# Altium footprint library PcbLib.PcbLib: 68 footprints (part 1 of 5)
Each footprint in its own frame and in the unit in brackets; x right, y up, seen from the top. Pads: shape width x height; smd on the part's side, far side on the other; paste and mask are expansions set on the pad; w line width, h text height; cw(c..) or ccw(c..) is an arc to the next point about the centre after c.
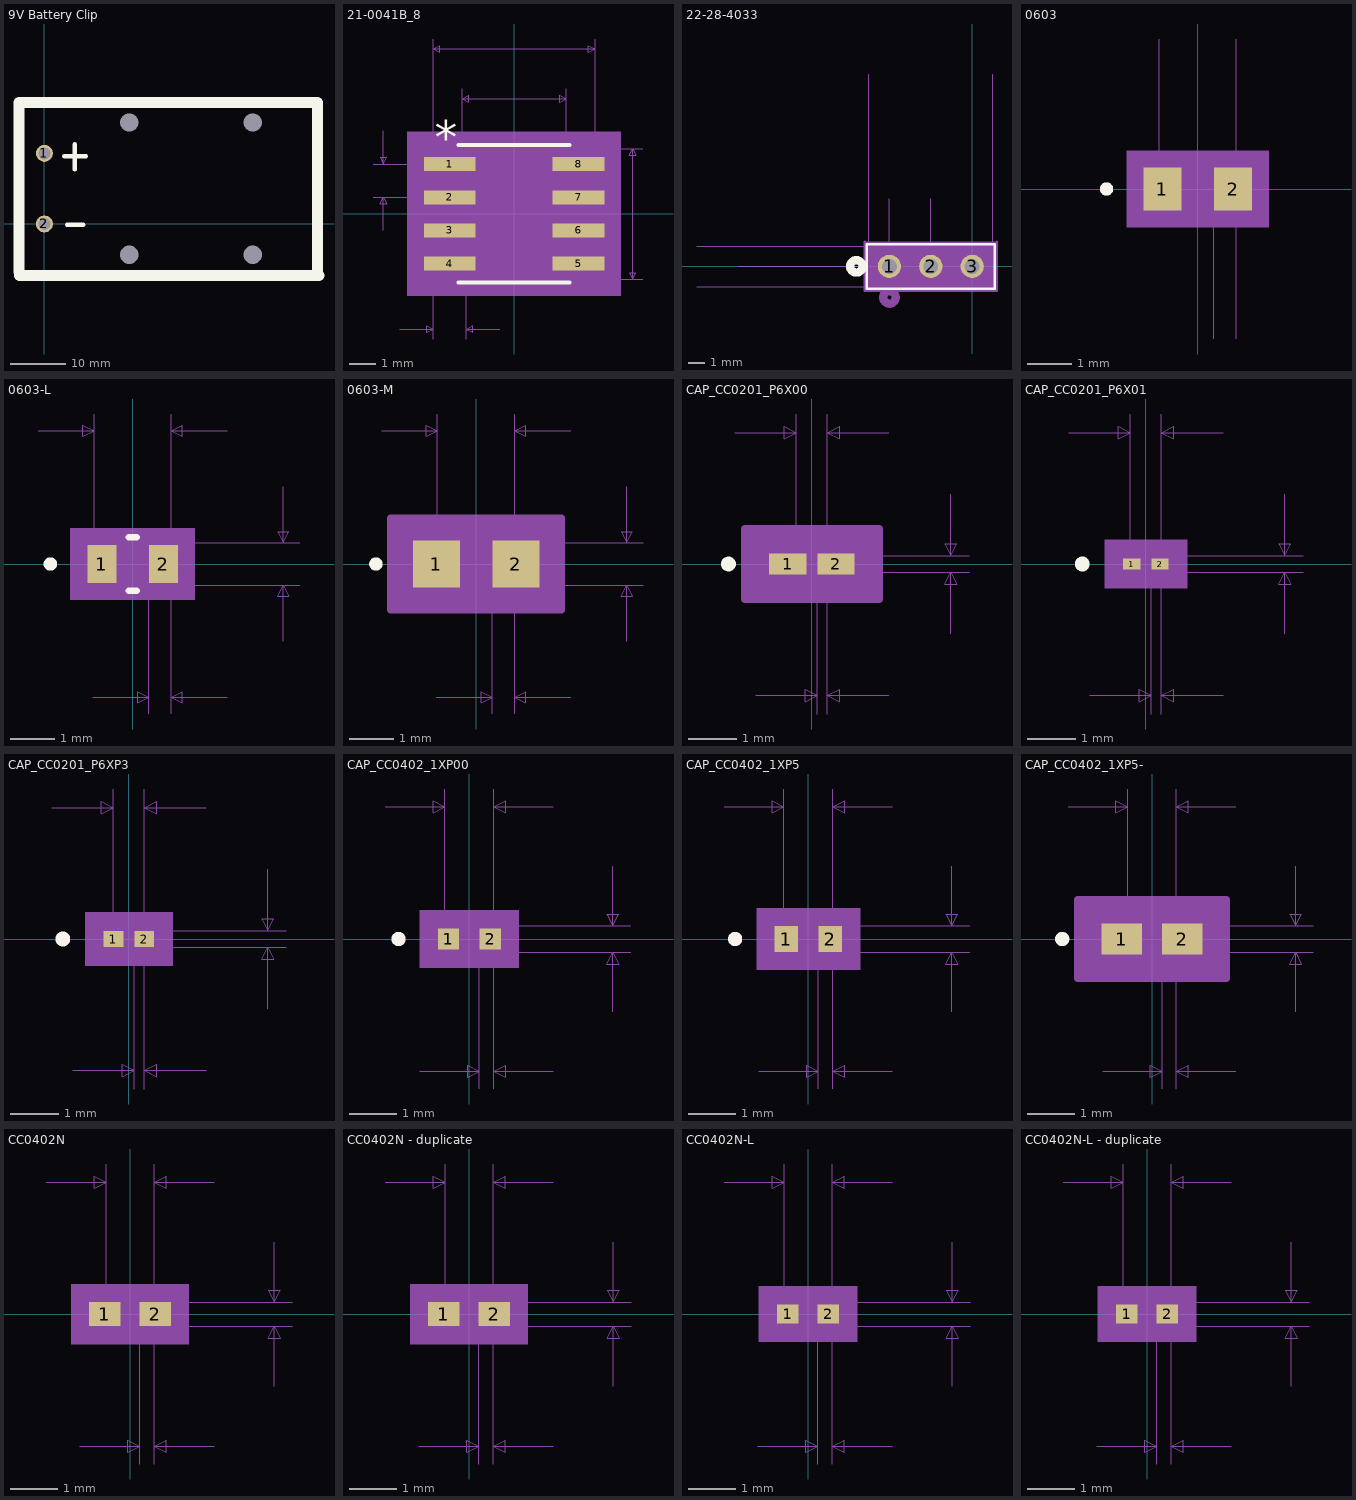
[diagram p0: the footprints below, top view; thin cyan lines are the x and y axes]

## 9V Battery Clip [mil]
pads (7):
  round 120 hole 85: 1(0,500) 2(0,0) 2(0,0)
  round 120 hole 130 unplated: ""(600,-219) ""(600,719) ""(1475,-219) ""(1475,719)
Top Overlay:
  lines w30: 140,480 295,480 ; 160,-5 275,-5 ; 215,385 215,565
  lines w80: -180,-340 -180,860 1930,860 ; -175,-365 1945,-365 ; 1935,-340 1935,860

## 21-0041B_8 [mil]
pads (8):
  rect 78x21 smd: 1(-97,75) 2(-97,25) 3(-97,-25) 4(-97,-75) 5(97,-75) 6(97,-25) 7(97,25) 8(97,75)
Top Overlay:
  lines w6: -83.5,-103.5 83.5,-103.5 ; -83.5,103.5 83.5,103.5
  text "*" at -119.5,91 h50
Mechanical 5:
  region: 161,-123.5 -161,-123.5 -161,123.5 161,123.5
Mechanical 7:
  lines w1: -212,25 -97,25 ; -212,75 -97,75 ; -197,-25 -197,25 ; -197,125 -197,75 ; -172,-173.5 -122,-173.5 ; -122,-188.5 -122,0 -122,263.5 ; -78.5,0 -78.5,188.5 ; -72,-188.5 -72,0 ; -22,-173.5 -72,-173.5 ; 0,-98.5 193.5,-98.5 ; 0,98.5 193.5,98.5 ; 78.5,0 78.5,188.5 ; 122,0 122,263.5 ; -197,25 -202,15 -192,15 -197,25 ; -197,75 -202,85 -192,85 -197,75 ; -122,-173.5 -132,-168.5 -132,-178.5 -122,-173.5 ; -122,248.5 122,248.5 ; -122,248.5 -112,253.5 -112,243.5 -122,248.5 ; -78.5,173.5 78.5,173.5 ; -78.5,173.5 -68.5,178.5 -68.5,168.5 -78.5,173.5 ; -72,-173.5 -62,-168.5 -62,-178.5 -72,-173.5 ; 78.5,173.5 68.5,178.5 68.5,168.5 78.5,173.5 ; 122,248.5 112,253.5 112,243.5 122,248.5 ; 178.5,-98.5 178.5,98.5 ; 178.5,-98.5 173.5,-88.5 183.5,-88.5 178.5,-98.5 ; 178.5,98.5 173.5,88.5 183.5,88.5 178.5,98.5
  text "Default Padstyle: RX78Y21D0T" at -350,-298.5 h50
  text "Pin One Padstyle: RX78Y21D0T" at -350,-358.5 h50
  text "Alt 1 Padstyle: OX60Y90D30P" at -337.5,-538.5 h50
  text "Alt 2 Padstyle: OX90Y60D30P" at -337.5,-598.5 h50
  text "0.157in/3.988mm" at -93.75,193.5 h25
  text "0.244in/6.198mm" at -93.75,268.5 h25
  text "0.197in/5.004mm" at 198.5,-12.5 h25
  text "0.05in/1.27mm" at -379.5,37.5 h25
  text "0.05in/1.27mm" at -178.25,-218.5 h25
Mechanical 13:
  lines w0: -12,98.5 ccw(c0,98.5) 12,98.5
  lines w1: -122,-84.5 -122,-65.5 -78.5,-65.5 -78.5,-84.5 -122,-84.5 ; -122,-34.5 -122,-15.5 -78.5,-15.5 -78.5,-34.5 -122,-34.5 ; -122,15.5 -122,34.5 -78.5,34.5 -78.5,15.5 -122,15.5 ; -122,65.5 -122,84.5 -78.5,84.5 -78.5,65.5 -122,65.5 ; -78.5,-98.5 78.5,-98.5 78.5,98.5 -78.5,98.5 -78.5,-98.5 ; 78.5,-84.5 78.5,-65.5 122,-65.5 122,-84.5 78.5,-84.5 ; 78.5,-34.5 78.5,-15.5 122,-15.5 122,-34.5 78.5,-34.5 ; 78.5,15.5 78.5,34.5 122,34.5 122,15.5 78.5,15.5 ; 78.5,65.5 78.5,84.5 122,84.5 122,65.5 78.5,65.5
  text "*" at -76,45.5 h50
Mechanical 15:
  region: -88.5,-95.5 -146,-95.5 -146,95.5 -88.5,95.5 -88.5,108.5 88.5,108.5 88.5,95.5 146,95.5 146,-95.5 88.5,-95.5 88.5,-108.5 -88.5,-108.5
  lines w6: -146,-95.5 -146,95.5 -88.5,95.5 -88.5,108.5 88.5,108.5 88.5,95.5 146,95.5 146,-95.5 88.5,-95.5 88.5,-108.5 -88.5,-108.5 -88.5,-95.5 -146,-95.5
3D body: height 10, standoff 0, extent 0,0 10,10

## 22-28-4033 [mil]
pads (3):
  round 56 hole 36: 1(-200,0) 2(-100,0) 3(0,0)
Top Overlay:
  circle w20: c-280,0 r15
  lines w6: -255,-54 55,-54 55,54 -255,54 -255,-54
Bottom Overlay:
  circle w20: c-280,0 r15
Mechanical 7:
  lines w1: -665,-49 -250,-49 ; -665,49 -250,49 ; -565,0 -100,0 -100,164 ; -565,49 -250,49 ; -250,464 -250,49 ; -200,0 -200,164 ; 50,49 50,464
Mechanical 13:
  circle w20: c-200,-75 r15
  lines w1: -250,-49 50,-49 50,49 -250,49 -250,-49
Mechanical 15:
  region: 60,59 -260,59 -260,-59 60,-59
  region: 50,49 -250,49 -250,-49 50,-49
  lines w6: -260,59 -260,-59 60,-59 60,59
3D body: height 10, standoff 0, extent 0,0 10,10

## 0603 [mil]
pads (2):
  rect 34x38 smd: 1(-31.5,0) 2(31.5,0)
Top Overlay:
  circle w6: c-81.5,0 r3
Mechanical 5:
  region: 63.5,-34 -63.5,-34 -63.5,34 63.5,34
Mechanical 7:
  lines w1: -34.5,0 -34.5,134 ; 14.5,-134 14.5,0 ; 34.5,-134 34.5,0 34.5,134
Mechanical 13:
  circle w0: c-81.5,0 r3
  lines w1: -34.5,-19 -34.5,19 ; -34.5,-19 -14.5,-19 -14.5,19 -34.5,19 ; -34.5,-19 34.5,-19 ; -34.5,-19 -34.5,19 ; -34.5,19 34.5,19 ; 34.5,-19 14.5,-19 14.5,19 34.5,19 ; 34.5,-19 34.5,19 ; 34.5,-19 34.5,19
Mechanical 15:
  region: 58.5,-29 -58.5,-29 -58.5,29 58.5,29
  lines w6: -58.5,-29 -58.5,29 58.5,29 58.5,-29 -58.5,-29
3D body: height 10, standoff 0, extent 0,0 10,10

## 0603-L [mil]
pads (2):
  rect 26x34 smd paste+0 mask+0: 1(-27.5,0) 2(27.5,0)
Top Overlay:
  circle w6: c-73.5,0 r3
  lines w6: -3.43,-24 3.43,-24 ; -3.43,24 3.43,24
Mechanical 5:
  region: 55.5,-32 -55.5,-32 -55.5,32 55.5,32
Mechanical 7:
  lines w1: -84.5,119 -34.5,119 ; -35.5,-119 14.5,-119 ; -34.5,0 -34.5,134 ; 0,-19 149.5,-19 ; 0,19 149.5,19 ; 14.5,-134 14.5,0 ; 34.5,-134 34.5,0 34.5,134 ; 84.5,-119 34.5,-119 ; 84.5,119 34.5,119 ; 134.5,-69 134.5,-19 ; 134.5,69 134.5,19 ; -34.5,119 -44.5,114 -44.5,124 -34.5,119 ; 14.5,-119 4.5,-124 4.5,-114 14.5,-119 ; 34.5,-119 44.5,-124 44.5,-114 34.5,-119 ; 34.5,119 44.5,114 44.5,124 34.5,119 ; 134.5,-19 139.5,-29 129.5,-29 134.5,-19 ; 134.5,19 139.5,29 129.5,29 134.5,19
  text "0.02in/0.508mm" at -63,-164 h25
  text "0.069in/1.753mm" at -93.75,139 h25
  text "0.038in/0.965mm" at 154.5,-12.5 h25
  text "Alternate 2 Padstyle: OX90Y60D30P" at -412.5,-487 h50
  text "Alternate 1 Padstyle: OX60Y90D30P" at -412.5,-387 h50
  text "Default Padstyle: RX26Y34D0T" at -350,-287 h50
Mechanical 13:
  circle w0: c-22.5,0 r3
  lines w1: -34.5,-19 -34.5,19 ; -34.5,-19 34.5,-19 ; -34.5,-19 -14.5,-19 -14.5,19 -34.5,19 ; -34.5,-19 -34.5,19 ; -34.5,19 34.5,19 ; 34.5,-19 34.5,19 ; 34.5,-19 34.5,19 ; 34.5,-19 14.5,-19 14.5,19 34.5,19
Mechanical 15:
  region: 44.5,-21 -44.5,-21 -44.5,21 44.5,21
  lines w6: -44.5,-21 44.5,-21 44.5,21 -44.5,21 -44.5,-21
3D body: height 10, standoff 0, extent 0,0 10,10

## 0603-M [mil]
pads (2):
  rect 42x42 smd paste+0 mask+0: 1(-35.5,0) 2(35.5,0)
Top Overlay:
  circle w6: c-89.5,0 r3
Mechanical 5:
  region: 71.5,-36 -71.5,-36 -71.5,36 71.5,36
Mechanical 7:
  lines w1: -84.5,119 -34.5,119 ; -35.5,-119 14.5,-119 ; -34.5,0 -34.5,134 ; 0,-19 149.5,-19 ; 0,19 149.5,19 ; 14.5,-134 14.5,0 ; 34.5,-134 34.5,0 34.5,134 ; 84.5,-119 34.5,-119 ; 84.5,119 34.5,119 ; 134.5,-69 134.5,-19 ; 134.5,69 134.5,19 ; -34.5,119 -44.5,124 -44.5,114 -34.5,119 ; 14.5,-119 4.5,-114 4.5,-124 14.5,-119 ; 34.5,-119 44.5,-114 44.5,-124 34.5,-119 ; 34.5,119 44.5,124 44.5,114 34.5,119 ; 134.5,-19 129.5,-29 139.5,-29 134.5,-19 ; 134.5,19 129.5,29 139.5,29 134.5,19
  text "Default Padstyle: RX42Y42D0T" at -350,-291 h50
  text "Alternate 1 Padstyle: OX60Y90D30P" at -412.5,-391 h50
  text "Alternate 2 Padstyle: OX90Y60D30P" at -412.5,-491 h50
  text "0.038in/0.965mm" at 154.5,-12.5 h25
  text "0.069in/1.753mm" at -93.75,139 h25
  text "0.02in/0.508mm" at -63,-164 h25
Mechanical 13:
  circle w0: c-30.5,0 r3
  lines w1: -34.5,-19 -34.5,19 ; -34.5,-19 -14.5,-19 -14.5,19 -34.5,19 ; -34.5,-19 34.5,-19 ; -34.5,-19 -34.5,19 ; -34.5,19 34.5,19 ; 34.5,-19 14.5,-19 14.5,19 34.5,19 ; 34.5,-19 34.5,19 ; 34.5,-19 34.5,19
Mechanical 15:
  region: 76.5,-41 -76.5,-41 -76.5,41 76.5,41
  lines w6: -76.5,-41 -76.5,41 76.5,41 76.5,-41 -76.5,-41
3D body: height 10, standoff 0, extent 0,0 10,10

## CAP_CC0201_P6X00 [mil]
pads (2):
  rect 30x17 smd paste+0 mask+0: 1(-19.5,0) 2(19.5,0)
Top Overlay:
  circle w6: c-67.5,0 r3
Mechanical 5:
  region: 49.5,-23.5 -49.5,-23.5 -49.5,23.5 49.5,23.5
Mechanical 7:
  lines w1: -62.5,106.5 -12.5,106.5 ; -45.5,-106.5 4.5,-106.5 ; -12.5,0 -12.5,121.5 ; 0,-6.5 127.5,-6.5 ; 0,6.5 127.5,6.5 ; 4.5,-121.5 4.5,0 ; 12.5,-121.5 12.5,0 12.5,121.5 ; 62.5,-106.5 12.5,-106.5 ; 62.5,106.5 12.5,106.5 ; 112.5,-56.5 112.5,-6.5 ; 112.5,56.5 112.5,6.5 ; -12.5,106.5 -22.5,111.5 -22.5,101.5 -12.5,106.5 ; 4.5,-106.5 -5.5,-101.5 -5.5,-111.5 4.5,-106.5 ; 12.5,-106.5 22.5,-101.5 22.5,-111.5 12.5,-106.5 ; 12.5,106.5 22.5,111.5 22.5,101.5 12.5,106.5 ; 112.5,-6.5 107.5,-16.5 117.5,-16.5 112.5,-6.5 ; 112.5,6.5 107.5,16.5 117.5,16.5 112.5,6.5
  text "Default Padstyle: RX30Y17D0T" at -350,-278.5 h50
  text "Alternate 1 Padstyle: OX60Y90D30P" at -412.5,-378.5 h50
  text "Alternate 2 Padstyle: OX90Y60D30P" at -412.5,-478.5 h50
  text "0.013in/0.33mm" at 132.5,-12.5 h25
  text "0.025in/0.635mm" at -93.75,126.5 h25
  text "0.008in/0.203mm" at -85.25,-151.5 h25
Mechanical 13:
  circle w0: c-14.5,0 r3
  lines w1: -12.5,-6.5 -12.5,6.5 ; -12.5,-6.5 -4.5,-6.5 -4.5,6.5 -12.5,6.5 ; -12.5,-6.5 12.5,-6.5 ; -12.5,-6.5 -12.5,6.5 ; -12.5,6.5 12.5,6.5 ; 12.5,-6.5 4.5,-6.5 4.5,6.5 12.5,6.5 ; 12.5,-6.5 12.5,6.5 ; 12.5,-6.5 12.5,6.5
Mechanical 15:
  region: 54.5,-28.5 -54.5,-28.5 -54.5,28.5 54.5,28.5
  lines w6: -54.5,-28.5 -54.5,28.5 54.5,28.5 54.5,-28.5 -54.5,-28.5
3D body: height 10, standoff 0, extent 0,0 10,10

## CAP_CC0201_P6X01 [mil]
pads (2):
  rect 14x9 smd paste+0 mask+0: 1(-11.5,0) 2(11.5,0)
Top Overlay:
  circle w6: c-51.5,0 r3
Mechanical 5:
  region: 33.5,-19.5 -33.5,-19.5 -33.5,19.5 33.5,19.5
Mechanical 7:
  lines w1: -62.5,106.5 -12.5,106.5 ; -45.5,-106.5 4.5,-106.5 ; -12.5,0 -12.5,121.5 ; 0,-6.5 127.5,-6.5 ; 0,6.5 127.5,6.5 ; 4.5,-121.5 4.5,0 ; 12.5,-121.5 12.5,0 12.5,121.5 ; 62.5,-106.5 12.5,-106.5 ; 62.5,106.5 12.5,106.5 ; 112.5,-56.5 112.5,-6.5 ; 112.5,56.5 112.5,6.5 ; -12.5,106.5 -22.5,101.5 -22.5,111.5 -12.5,106.5 ; 4.5,-106.5 -5.5,-111.5 -5.5,-101.5 4.5,-106.5 ; 12.5,-106.5 22.5,-111.5 22.5,-101.5 12.5,-106.5 ; 12.5,106.5 22.5,101.5 22.5,111.5 12.5,106.5 ; 112.5,-6.5 117.5,-16.5 107.5,-16.5 112.5,-6.5 ; 112.5,6.5 117.5,16.5 107.5,16.5 112.5,6.5
  text "0.008in/0.203mm" at -85.25,-151.5 h25
  text "0.025in/0.635mm" at -93.75,126.5 h25
  text "0.013in/0.33mm" at 132.5,-12.5 h25
  text "Alternate 2 Padstyle: OX90Y60D30P" at -412.5,-474.5 h50
  text "Alternate 1 Padstyle: OX60Y90D30P" at -412.5,-374.5 h50
  text "Default Padstyle: RX14Y9D0T" at -337.5,-274.5 h50
Mechanical 13:
  circle w0: c-6.5,0 r3
  lines w1: -12.5,-6.5 -12.5,6.5 ; -12.5,-6.5 12.5,-6.5 ; -12.5,-6.5 -4.5,-6.5 -4.5,6.5 -12.5,6.5 ; -12.5,-6.5 -12.5,6.5 ; -12.5,6.5 12.5,6.5 ; 12.5,-6.5 12.5,6.5 ; 12.5,-6.5 12.5,6.5 ; 12.5,-6.5 4.5,-6.5 4.5,6.5 12.5,6.5
Mechanical 15:
  region: 22.5,-8.5 -22.5,-8.5 -22.5,8.5 22.5,8.5
  lines w6: -22.5,-8.5 22.5,-8.5 22.5,8.5 -22.5,8.5 -22.5,-8.5
3D body: height 10, standoff 0, extent 0,0 10,10

## CAP_CC0201_P6XP3 [mil]
pads (2):
  rect 16x13 smd paste+0 mask+0: 1(-12.5,0) 2(12.5,0)
Top Overlay:
  circle w6: c-53.5,0 r3
Mechanical 5:
  region: 35.5,-21.5 -35.5,-21.5 -35.5,21.5 35.5,21.5
Mechanical 7:
  lines w1: -62.5,106.5 -12.5,106.5 ; -45.5,-106.5 4.5,-106.5 ; -12.5,0 -12.5,121.5 ; 0,-6.5 127.5,-6.5 ; 0,6.5 127.5,6.5 ; 4.5,-121.5 4.5,0 ; 12.5,-121.5 12.5,0 12.5,121.5 ; 62.5,-106.5 12.5,-106.5 ; 62.5,106.5 12.5,106.5 ; 112.5,-56.5 112.5,-6.5 ; 112.5,56.5 112.5,6.5 ; -12.5,106.5 -22.5,111.5 -22.5,101.5 -12.5,106.5 ; 4.5,-106.5 -5.5,-101.5 -5.5,-111.5 4.5,-106.5 ; 12.5,-106.5 22.5,-101.5 22.5,-111.5 12.5,-106.5 ; 12.5,106.5 22.5,111.5 22.5,101.5 12.5,106.5 ; 112.5,-6.5 107.5,-16.5 117.5,-16.5 112.5,-6.5 ; 112.5,6.5 107.5,16.5 117.5,16.5 112.5,6.5
  text "Default Padstyle: RX16Y13D0T" at -350,-276.5 h50
  text "Alternate 1 Padstyle: OX60Y90D30P" at -412.5,-376.5 h50
  text "Alternate 2 Padstyle: OX90Y60D30P" at -412.5,-476.5 h50
  text "0.013in/0.33mm" at 132.5,-12.5 h25
  text "0.025in/0.635mm" at -93.75,126.5 h25
  text "0.008in/0.203mm" at -85.25,-151.5 h25
Mechanical 13:
  circle w0: c-7.5,0 r3
  lines w1: -12.5,-6.5 -12.5,6.5 ; -12.5,-6.5 -4.5,-6.5 -4.5,6.5 -12.5,6.5 ; -12.5,-6.5 12.5,-6.5 ; -12.5,-6.5 -12.5,6.5 ; -12.5,6.5 12.5,6.5 ; 12.5,-6.5 4.5,-6.5 4.5,6.5 12.5,6.5 ; 12.5,-6.5 12.5,6.5 ; 12.5,-6.5 12.5,6.5
Mechanical 15:
  region: 30.5,-16.5 -30.5,-16.5 -30.5,16.5 30.5,16.5
  lines w6: -30.5,-16.5 -30.5,16.5 30.5,16.5 30.5,-16.5 -30.5,-16.5
3D body: height 10, standoff 0, extent 0,0 10,10

## CAP_CC0402_1XP00 [mil]
pads (2):
  rect 18x18 smd paste+0 mask+0: 1(-17.5,0) 2(17.5,0)
Top Overlay:
  circle w6: c-59.5,0 r3
Mechanical 5:
  region: 41.5,-24 -41.5,-24 -41.5,24 41.5,24
Mechanical 7:
  lines w1: -70.5,111 -20.5,111 ; -41.5,-111 8.5,-111 ; -20.5,0 -20.5,126 ; 0,-11 135.5,-11 ; 0,11 135.5,11 ; 8.5,-126 8.5,0 ; 20.5,-126 20.5,0 20.5,126 ; 70.5,-111 20.5,-111 ; 70.5,111 20.5,111 ; 120.5,-61 120.5,-11 ; 120.5,61 120.5,11 ; -20.5,111 -30.5,106 -30.5,116 -20.5,111 ; 8.5,-111 -1.5,-116 -1.5,-106 8.5,-111 ; 20.5,-111 30.5,-116 30.5,-106 20.5,-111 ; 20.5,111 30.5,106 30.5,116 20.5,111 ; 120.5,-11 125.5,-21 115.5,-21 120.5,-11 ; 120.5,11 125.5,21 115.5,21 120.5,11
  text "0.012in/0.305mm" at -79.25,-156 h25
  text "0.041in/1.041mm" at -93.75,131 h25
  text "0.022in/0.559mm" at 140.5,-12.5 h25
  text "Alternate 2 Padstyle: OX90Y60D30P" at -412.5,-479 h50
  text "Alternate 1 Padstyle: OX60Y90D30P" at -412.5,-379 h50
  text "Default Padstyle: RX18Y18D0T" at -350,-279 h50
Mechanical 13:
  circle w0: c-12.5,0 r3
  lines w1: -20.5,-11 -20.5,11 ; -20.5,-11 20.5,-11 ; -20.5,-11 -8.5,-11 -8.5,11 -20.5,11 ; -20.5,-11 -20.5,11 ; -20.5,11 20.5,11 ; 20.5,-11 20.5,11 ; 20.5,-11 20.5,11 ; 20.5,-11 8.5,-11 8.5,11 20.5,11
Mechanical 15:
  region: 30.5,-13 -30.5,-13 -30.5,13 30.5,13
  lines w6: -30.5,-13 30.5,-13 30.5,13 -30.5,13 -30.5,-13
3D body: height 10, standoff 0, extent 0,0 10,10

## CAP_CC0402_1XP5 [mil]
pads (2):
  rect 20x22 smd paste+0 mask+0: 1(-18.5,0) 2(18.5,0)
Top Overlay:
  circle w6: c-61.5,0 r3
Mechanical 5:
  region: 43.5,-26 -43.5,-26 -43.5,26 43.5,26
Mechanical 7:
  lines w1: -70.5,111 -20.5,111 ; -41.5,-111 8.5,-111 ; -20.5,0 -20.5,126 ; 0,-11 135.5,-11 ; 0,11 135.5,11 ; 8.5,-126 8.5,0 ; 20.5,-126 20.5,0 20.5,126 ; 70.5,-111 20.5,-111 ; 70.5,111 20.5,111 ; 120.5,-61 120.5,-11 ; 120.5,61 120.5,11 ; -20.5,111 -30.5,116 -30.5,106 -20.5,111 ; 8.5,-111 -1.5,-106 -1.5,-116 8.5,-111 ; 20.5,-111 30.5,-106 30.5,-116 20.5,-111 ; 20.5,111 30.5,116 30.5,106 20.5,111 ; 120.5,-11 115.5,-21 125.5,-21 120.5,-11 ; 120.5,11 115.5,21 125.5,21 120.5,11
  text "Default Padstyle: RX20Y22D0T" at -350,-281 h50
  text "Alternate 1 Padstyle: OX60Y90D30P" at -412.5,-381 h50
  text "Alternate 2 Padstyle: OX90Y60D30P" at -412.5,-481 h50
  text "0.022in/0.559mm" at 140.5,-12.5 h25
  text "0.041in/1.041mm" at -93.75,131 h25
  text "0.012in/0.305mm" at -79.25,-156 h25
Mechanical 13:
  circle w0: c-13.5,0 r3
  lines w1: -20.5,-11 -20.5,11 ; -20.5,-11 -8.5,-11 -8.5,11 -20.5,11 ; -20.5,-11 20.5,-11 ; -20.5,-11 -20.5,11 ; -20.5,11 20.5,11 ; 20.5,-11 8.5,-11 8.5,11 20.5,11 ; 20.5,-11 20.5,11 ; 20.5,-11 20.5,11
Mechanical 15:
  region: 38.5,-21 -38.5,-21 -38.5,21 38.5,21
  lines w6: -38.5,-21 -38.5,21 38.5,21 38.5,-21 -38.5,-21
3D body: height 10, standoff 0, extent 0,0 10,10

## CAP_CC0402_1XP5- [mil]
pads (2):
  rect 34x26 smd paste+0 mask+0: 1(-25.5,0) 2(25.5,0)
Top Overlay:
  circle w6: c-75.5,0 r3
Mechanical 5:
  region: 57.5,-28 -57.5,-28 -57.5,28 57.5,28
Mechanical 7:
  lines w1: -70.5,111 -20.5,111 ; -41.5,-111 8.5,-111 ; -20.5,0 -20.5,126 ; 0,-11 135.5,-11 ; 0,11 135.5,11 ; 8.5,-126 8.5,0 ; 20.5,-126 20.5,0 20.5,126 ; 70.5,-111 20.5,-111 ; 70.5,111 20.5,111 ; 120.5,-61 120.5,-11 ; 120.5,61 120.5,11 ; -20.5,111 -30.5,106 -30.5,116 -20.5,111 ; 8.5,-111 -1.5,-116 -1.5,-106 8.5,-111 ; 20.5,-111 30.5,-116 30.5,-106 20.5,-111 ; 20.5,111 30.5,106 30.5,116 20.5,111 ; 120.5,-11 125.5,-21 115.5,-21 120.5,-11 ; 120.5,11 125.5,21 115.5,21 120.5,11
  text "0.012in/0.305mm" at -79.25,-156 h25
  text "0.041in/1.041mm" at -93.75,131 h25
  text "0.022in/0.559mm" at 140.5,-12.5 h25
  text "Alternate 2 Padstyle: OX90Y60D30P" at -412.5,-483 h50
  text "Alternate 1 Padstyle: OX60Y90D30P" at -412.5,-383 h50
  text "Default Padstyle: RX34Y26D0T" at -350,-283 h50
Mechanical 13:
  circle w0: c-20.5,0 r3
  lines w1: -20.5,-11 -20.5,11 ; -20.5,-11 20.5,-11 ; -20.5,-11 -8.5,-11 -8.5,11 -20.5,11 ; -20.5,-11 -20.5,11 ; -20.5,11 20.5,11 ; 20.5,-11 20.5,11 ; 20.5,-11 20.5,11 ; 20.5,-11 8.5,-11 8.5,11 20.5,11
Mechanical 15:
  region: 62.5,-33 -62.5,-33 -62.5,33 62.5,33
  lines w6: -62.5,-33 62.5,-33 62.5,33 -62.5,33 -62.5,-33
3D body: height 10, standoff 0, extent 0,0 10,10

## CC0402N [mil]
pads (2):
  rect 26x20 smd: 1(-21,0) 2(21,0)
Mechanical 5:
  region: 49,-25 -49,-25 -49,25 49,25
Mechanical 7:
  lines w1: -70,110 -20,110 ; -42,-110 8,-110 ; -20,0 -20,125 ; 0,-10 135,-10 ; 0,10 135,10 ; 8,-125 8,0 ; 20,-125 20,0 20,125 ; 70,-110 20,-110 ; 70,110 20,110 ; 120,-60 120,-10 ; 120,60 120,10 ; -20,110 -30,105 -30,115 -20,110 ; 8,-110 -2,-115 -2,-105 8,-110 ; 20,-110 30,-115 30,-105 20,-110 ; 20,110 30,105 30,115 20,110 ; 120,-10 125,-20 115,-20 120,-10 ; 120,10 125,20 115,20 120,10
  text "0.012in/0.305mm" at -79.75,-155 h25
  text "0.04in/1.016mm" at -87.5,130 h25
  text "0.02in/0.508mm" at 140,-12.5 h25
  text "Alternate 2 Padstyle: OX90Y60D30P" at -412.5,-480 h50
  text "Alternate 1 Padstyle: OX60Y90D30P" at -412.5,-380 h50
  text "Default Padstyle: RX26Y20D0T" at -350,-280 h50
Mechanical 13:
  lines w1: -20,-10 -20,10 ; -20,-10 20,-10 ; -20,-10 -8,-10 -8,10 -20,10 ; -20,-10 -20,10 ; -20,10 20,10 ; 20,-10 20,10 ; 20,-10 20,10 ; 20,-10 8,-10 8,10 20,10
Mechanical 15:
  region: 44,-20 -44,-20 -44,20 44,20
  lines w6: -44,-20 44,-20 44,20 -44,20 -44,-20
3D body: height 10, standoff 0, extent 0,0 10,10

## CC0402N - duplicate [mil]
pads (2):
  rect 26x20 smd: 1(-21,0) 2(21,0)
Mechanical 5:
  region: 49,-25 -49,-25 -49,25 49,25
Mechanical 7:
  lines w1: -70,110 -20,110 ; -42,-110 8,-110 ; -20,0 -20,125 ; 0,-10 135,-10 ; 0,10 135,10 ; 8,-125 8,0 ; 20,-125 20,0 20,125 ; 70,-110 20,-110 ; 70,110 20,110 ; 120,-60 120,-10 ; 120,60 120,10 ; -20,110 -30,115 -30,105 -20,110 ; 8,-110 -2,-105 -2,-115 8,-110 ; 20,-110 30,-105 30,-115 20,-110 ; 20,110 30,115 30,105 20,110 ; 120,-10 115,-20 125,-20 120,-10 ; 120,10 115,20 125,20 120,10
  text "Default Padstyle: RX26Y20D0T" at -350,-280 h50
  text "Alternate 1 Padstyle: OX60Y90D30P" at -412.5,-380 h50
  text "Alternate 2 Padstyle: OX90Y60D30P" at -412.5,-480 h50
  text "0.02in/0.508mm" at 140,-12.5 h25
  text "0.04in/1.016mm" at -87.5,130 h25
  text "0.012in/0.305mm" at -79.75,-155 h25
Mechanical 13:
  lines w1: -20,-10 -20,10 ; -20,-10 -8,-10 -8,10 -20,10 ; -20,-10 20,-10 ; -20,-10 -20,10 ; -20,10 20,10 ; 20,-10 8,-10 8,10 20,10 ; 20,-10 20,10 ; 20,-10 20,10
Mechanical 15:
  region: 44,-20 -44,-20 -44,20 44,20
  lines w6: -44,-20 -44,20 44,20 44,-20 -44,-20
3D body: height 10, standoff 0, extent 0,0 10,10

## CC0402N-L [mil]
pads (2):
  rect 18x16 smd paste+0 mask+0: 1(-17,0) 2(17,0)
Mechanical 5:
  region: 41,-23 -41,-23 -41,23 41,23
Mechanical 7:
  lines w1: -70,110 -20,110 ; -42,-110 8,-110 ; -20,0 -20,125 ; 0,-10 135,-10 ; 0,10 135,10 ; 8,-125 8,0 ; 20,-125 20,0 20,125 ; 70,-110 20,-110 ; 70,110 20,110 ; 120,-60 120,-10 ; 120,60 120,10 ; -20,110 -30,115 -30,105 -20,110 ; 8,-110 -2,-105 -2,-115 8,-110 ; 20,-110 30,-105 30,-115 20,-110 ; 20,110 30,115 30,105 20,110 ; 120,-10 115,-20 125,-20 120,-10 ; 120,10 115,20 125,20 120,10
  text "Default Padstyle: RX18Y16D0T" at -350,-278 h50
  text "Alternate 1 Padstyle: OX60Y90D30P" at -412.5,-378 h50
  text "Alternate 2 Padstyle: OX90Y60D30P" at -412.5,-478 h50
  text "0.02in/0.508mm" at 140,-12.5 h25
  text "0.04in/1.016mm" at -87.5,130 h25
  text "0.012in/0.305mm" at -79.75,-155 h25
Mechanical 13:
  lines w1: -20,-10 -20,10 ; -20,-10 -8,-10 -8,10 -20,10 ; -20,-10 20,-10 ; -20,-10 -20,10 ; -20,10 20,10 ; 20,-10 8,-10 8,10 20,10 ; 20,-10 20,10 ; 20,-10 20,10
Mechanical 15:
  region: 30,-12 -30,-12 -30,12 30,12
  lines w6: -30,-12 -30,12 30,12 30,-12 -30,-12
3D body: height 10, standoff 0, extent 0,0 10,10

## CC0402N-L - duplicate [mil]
pads (2):
  rect 18x16 smd paste+0 mask+0: 1(-17,0) 2(17,0)
Mechanical 5:
  region: 41,-23 -41,-23 -41,23 41,23
Mechanical 7:
  lines w1: -70,110 -20,110 ; -42,-110 8,-110 ; -20,0 -20,125 ; 0,-10 135,-10 ; 0,10 135,10 ; 8,-125 8,0 ; 20,-125 20,0 20,125 ; 70,-110 20,-110 ; 70,110 20,110 ; 120,-60 120,-10 ; 120,60 120,10 ; -20,110 -30,115 -30,105 -20,110 ; 8,-110 -2,-105 -2,-115 8,-110 ; 20,-110 30,-105 30,-115 20,-110 ; 20,110 30,115 30,105 20,110 ; 120,-10 115,-20 125,-20 120,-10 ; 120,10 115,20 125,20 120,10
  text "Default Padstyle: RX18Y16D0T" at -350,-278 h50
  text "Alternate 1 Padstyle: OX60Y90D30P" at -412.5,-378 h50
  text "Alternate 2 Padstyle: OX90Y60D30P" at -412.5,-478 h50
  text "0.02in/0.508mm" at 140,-12.5 h25
  text "0.04in/1.016mm" at -87.5,130 h25
  text "0.012in/0.305mm" at -79.75,-155 h25
Mechanical 13:
  lines w1: -20,-10 -20,10 ; -20,-10 -8,-10 -8,10 -20,10 ; -20,-10 20,-10 ; -20,-10 -20,10 ; -20,10 20,10 ; 20,-10 8,-10 8,10 20,10 ; 20,-10 20,10 ; 20,-10 20,10
Mechanical 15:
  region: 30,-12 -30,-12 -30,12 30,12
  lines w6: -30,-12 -30,12 30,12 30,-12 -30,-12
3D body: height 10, standoff 0, extent 0,0 10,10